# Altium footprint library Sajad_Altium_Library.PcbLib: 333 footprints (part 20 of 21)
Each footprint in its own frame and in the unit in brackets; x right, y up, seen from the top. Pads: shape width x height; smd on the part's side, far side on the other; paste and mask are expansions set on the pad; w line width, h text height; cw(c..) or ccw(c..) is an arc to the next point about the centre after c.
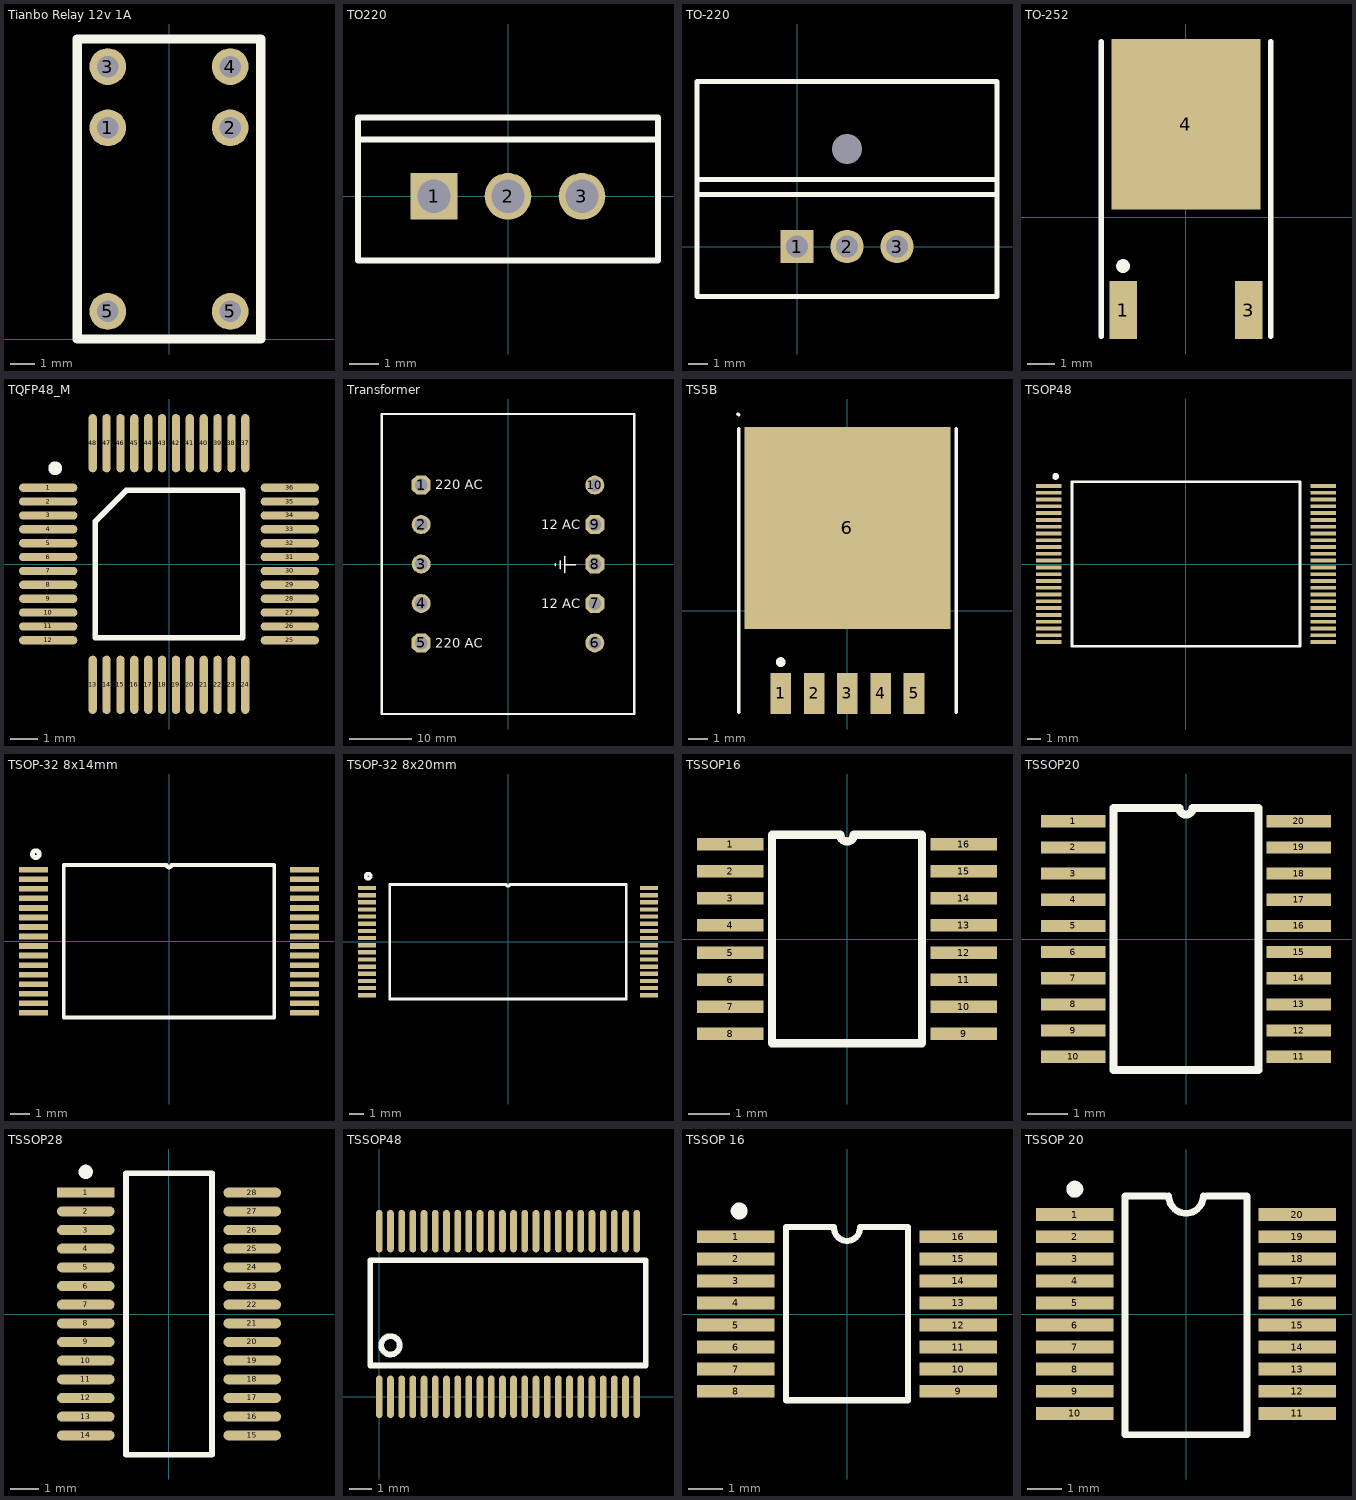
[diagram p19: the footprints below, top view; thin cyan lines are the x and y axes]

## Tianbo Relay 12v 1A [mil] "Tianbo Relay 12v 1A"
pads (6):
  round 60 hole 35: 1(-100,345) 2(100,345) 3(-100,445) 4(100,445) 5(-100,45) 5(100,45)
Top Overlay:
  lines w15: -150,0 -150,490 150,490 150,0 -150,0

## TO220 [mm] "TO220"
pads (3):
  rect 1.6x1.6 hole 1.143: 1(-2.54,0)
  round 1.6 hole 1.143: 2(0,0) 3(2.54,0)
Top Overlay:
  lines w0.2: -5.15,1.946 5.15,1.946 ; -5.15,-2.2 5.15,-2.2 5.15,2.7 -5.15,2.7 -5.15,-2.2
3D body: height 20.8, standoff -7.98, extent -4.95,-2.159 4.95,2.341

## TO-220 [mm] "With Heatsink"
pads (4):
  rect 1.7x1.7 hole 1.1: 1(0,0)
  round 1.7 hole 1.1: 2(2.54,0) 3(5.08,0)
  round 0 hole 1.524: 4(2.54,4.953)
Top Overlay:
  lines w0.254: -5.08,2.642 10.16,2.642 ; -5.08,3.404 10.16,3.404 ; -5.08,-2.54 -5.08,4.953 -5.08,8.382 10.16,8.382 10.16,-2.54 7.366,-2.54 -2.413,-2.54 -5.08,-2.54
3D body: height 20.8, standoff -7.98, extent -2.41,-2.159 7.49,2.341
3D body: height 25, standoff -3.8, extent -4.851,-2.48 9.931,8.322

## TO-252 [mm]
pads (3):
  rect 1x2.1 smd: 1(-2.285,-3.375) 3(2.285,-3.375)
  rect 5.4x6.2 smd: 4(0,3.375)
Top Overlay:
  circle w0.25: c-2.285,-1.775 r0.125
  lines w0.2: -3.085,-4.325 -3.085,6.375 ; 3.085,-4.325 3.085,6.375
3D body: height 2.34, standoff -0.07, extent -3.27,-3.906 3.27,6.033

## TQFP48_M [mm] "48-Pin Thin Quad Flat Pack 0.5 mm Pitch, IPC Low Density"
height 1.6
pads (48):
  oval 2.1x0.3 smd: 1(-4.354,2.75) 2(-4.354,2.25) 3(-4.354,1.75) 4(-4.354,1.25) 5(-4.354,0.75) 6(-4.354,0.25) 7(-4.354,-0.25) 8(-4.354,-0.75) 9(-4.354,-1.25) 10(-4.354,-1.75) 11(-4.354,-2.25) 12(-4.354,-2.75) 25(4.354,-2.75) 26(4.354,-2.25) 27(4.354,-1.75) 28(4.354,-1.25) 29(4.354,-0.75) 30(4.354,-0.25) 31(4.354,0.25) 32(4.354,0.75) 33(4.354,1.25) 34(4.354,1.75) 35(4.354,2.25) 36(4.354,2.75)
  oval 0.3x2.1 smd: 13(-2.75,-4.354) 14(-2.25,-4.354) 15(-1.75,-4.354) 16(-1.25,-4.354) 17(-0.75,-4.354) 18(-0.25,-4.354) 19(0.25,-4.354) 20(0.75,-4.354) 21(1.25,-4.354) 22(1.75,-4.354) 23(2.25,-4.354) 24(2.75,-4.354) 37(2.75,4.354) 38(2.25,4.354) 39(1.75,4.354) 40(1.25,4.354) 41(0.75,4.354) 42(0.25,4.354) 43(-0.25,4.354) 44(-0.75,4.354) 45(-1.25,4.354) 46(-1.75,4.354) 47(-2.25,4.354) 48(-2.75,4.354)
Top Overlay:
  circle w0.25: c-4.1,3.45 r0.125
  lines w0.2: -2.65,-2.65 -2.65,1.541 -1.541,2.65 2.65,2.65 2.65,-2.65 -2.65,-2.65
3D body: height 1.56, standoff -0.01, extent -4.386,-4.386 4.386,4.386

## Transformer [mil] "On Board Transformer"
pads (10):
  oct 120x120 hole 80: 1(-550,500) 5(-550,-500) 7(550,-250) 8(550,0) 9(550,250)
  round 120 hole 80: 2(-550,250) 3(-550,0) 4(-550,-250) 6(550,-500) 10(550,500)
Top Overlay:
  lines w10: 300,-10 300,0 ; 330,-30 330,20 ; 360,-55 360,-5 ; 360,50 360,-5 ; 430,-5 360,-5
  lines w15: -800,-950 -800,950 800,950 800,-950 -800,-950
  text "12 AC" at 210,-280 h60
  text "12 AC" at 210,220 h60
  text "220 AC" at -460,475 h60
  text "220 AC" at -460,-530 h60

## TS5B [mm]
pads (6):
  rect 1.05x2.1 smd: 1(-3.4,-4.225) 2(-1.7,-4.225) 3(0,-4.225) 4(1.7,-4.225) 5(3.4,-4.225)
  rect 10.5x10.3 smd: 6(0,4.225)
Top Overlay:
  circle w0.25: c-3.4,-2.625 r0.125
  lines w0.178: -5.588,10.033 -5.55,9.995 ; -5.55,-5.175 -5.55,9.275 ; 5.55,-5.175 5.55,9.275
3D body: height 4.56, standoff 0, extent -5.08,-4.922 5.08,9.093

## TSOP48 [mil] "Shrink Small Outline, Plastic, Thin; 48 Leads; Body Width 18.4 mm; Pitch 0.5 mm"
height 47.24
pads (48):
  rect 74x11 smd: 1(-397.95,226.38) 2(-397.95,206.69) 3(-397.95,187.01) 4(-397.95,167.32) 5(-397.95,147.64) 6(-397.95,127.95) 7(-397.95,108.27) 8(-397.95,88.58) 9(-397.95,68.9) 10(-397.95,49.21) 11(-397.95,29.53) 12(-397.95,9.84) 13(-397.95,-9.84) 14(-397.95,-29.53) 15(-397.95,-49.21) 16(-397.95,-68.9) 17(-397.95,-88.58) 18(-397.95,-108.27) 19(-397.95,-127.95) 20(-397.95,-147.64) 21(-397.95,-167.32) 22(-397.95,-187.01) 23(-397.95,-206.69) 24(-397.95,-226.38) 25(397.95,-226.38) 26(397.95,-206.69) 27(397.95,-187.01) 28(397.95,-167.32) 29(397.95,-147.64) 30(397.95,-127.95) 31(397.95,-108.27) 32(397.95,-88.58) 33(397.95,-68.9) 34(397.95,-49.21) 35(397.95,-29.53) 36(397.95,-9.84) 37(397.95,9.84) 38(397.95,29.53) 39(397.95,49.21) 40(397.95,68.9) 41(397.95,88.58) 42(397.95,108.27) 43(397.95,127.95) 44(397.95,147.64) 45(397.95,167.32) 46(397.95,187.01) 47(397.95,206.69) 48(397.95,226.38)
Top Overlay:
  circle w9.84: c-377.95,253.94 r4.92
  lines w7.87: -330.71,-238.19 330.71,-238.19 330.71,238.19 -330.71,238.19 -330.71,-238.19
3D body: height 41.47, standoff -1.47, extent -393.76,-236.21 393.78,236.23

## TSOP-32 8x14mm [mm] "Use with SST39VF020"
pads (32):
  rect 1.524x0.3 smd: 1(-7.104,3.75) 2(-7.104,3.25) 3(-7.104,2.75) 4(-7.104,2.25) 5(-7.104,1.75) 6(-7.104,1.25) 7(-7.104,0.75) 8(-7.104,0.25) 9(-7.104,-0.25) 10(-7.104,-0.75) 11(-7.104,-1.25) 12(-7.104,-1.75) 13(-7.104,-2.25) 14(-7.104,-2.75) 15(-7.104,-3.25) 16(-7.104,-3.75) 17(7.104,-3.75) 18(7.104,-3.25) 19(7.104,-2.75) 20(7.104,-2.25) 21(7.104,-1.75) 22(7.104,-1.25) 23(7.104,-0.75) 24(7.104,-0.25) 25(7.104,0.25) 26(7.104,0.75) 27(7.104,1.25) 28(7.104,1.75) 29(7.104,2.25) 30(7.104,2.75) 31(7.104,3.25) 32(7.104,3.75)
Top Overlay:
  circle w0.254: c-6.985,4.572 r0.18
  lines w0.2: -5.515,-4 -5.515,4 -0.125,4 ccw(c0,4) 0.125,4 5.515,4 5.515,-4 -5.515,-4

## TSOP-32 8x20mm [mm] "Use with AS7C31024B"
pads (32):
  rect 1.27x0.3 smd: 1(-9.854,3.75) 2(-9.854,3.25) 3(-9.854,2.75) 4(-9.854,2.25) 5(-9.854,1.75) 6(-9.854,1.25) 7(-9.854,0.75) 8(-9.854,0.25) 9(-9.854,-0.25) 10(-9.854,-0.75) 11(-9.854,-1.25) 12(-9.854,-1.75) 13(-9.854,-2.25) 14(-9.854,-2.75) 15(-9.854,-3.25) 16(-9.854,-3.75) 17(9.854,-3.75) 18(9.854,-3.25) 19(9.854,-2.75) 20(9.854,-2.25) 21(9.854,-1.75) 22(9.854,-1.25) 23(9.854,-0.75) 24(9.854,-0.25) 25(9.854,0.25) 26(9.854,0.75) 27(9.854,1.25) 28(9.854,1.75) 29(9.854,2.25) 30(9.854,2.75) 31(9.854,3.25) 32(9.854,3.75)
Top Overlay:
  circle w0.254: c-9.779,4.572 r0.18
  lines w0.2: -8.265,-4 8.265,-4 8.265,4 0.125,4 cw(c0,4) -0.125,4 -8.265,4 -8.265,-4

## TSSOP16 [mm] "TSSOP 16 Pin"
height 1.2
pads (16):
  rect 1.6x0.3 smd: 1(-2.8,2.275) 2(-2.8,1.625) 3(-2.8,0.975) 4(-2.8,0.325) 5(-2.8,-0.325) 6(-2.8,-0.975) 7(-2.8,-1.625) 8(-2.8,-2.275) 9(2.8,-2.275) 10(2.8,-1.625) 11(2.8,-0.975) 12(2.8,-0.325) 13(2.8,0.325) 14(2.8,0.975) 15(2.8,1.625) 16(2.8,2.275)
Top Overlay:
  lines w0.2: -0.175,2.5 -0.913,2.5 -1.8,2.5 -1.8,-2.5 1.8,-2.5 1.8,2.5 0.913,2.5 0.175,2.5 ; -0.162,2.5 ccw(c0,2.5) 0.163,2.5
3D body: height 1.28, standoff 0, extent -3.2,-2.5 3.2,2.5

## TSSOP20 [mm] "TSSOP 20 Pin"
height 1.2
pads (20):
  rect 1.6x0.3 smd: 1(-2.8,2.925) 2(-2.8,2.275) 3(-2.8,1.625) 4(-2.8,0.975) 5(-2.8,0.325) 6(-2.8,-0.325) 7(-2.8,-0.975) 8(-2.8,-1.625) 9(-2.8,-2.275) 10(-2.8,-2.925) 11(2.8,-2.925) 12(2.8,-2.275) 13(2.8,-1.625) 14(2.8,-0.975) 15(2.8,-0.325) 16(2.8,0.325) 17(2.8,0.975) 18(2.8,1.625) 19(2.8,2.275) 20(2.8,2.925)
Top Overlay:
  lines w0.2: -1.8,-3.25 -1.8,3.25 -0.162,3.25 ccw(c0,3.25) 0.162,3.25 1.8,3.25 1.8,-3.25 -1.8,-3.25
3D body: height 1.28, standoff 0, extent -3.2,-3.25 3.2,3.25

## TSSOP28 [mm] "TSOP, 28-Leads, Body 9.7x4.4mm, Pitch 0.65mm, IPC Low Density"
height 1.2
pads (28):
  rect 2x0.35 smd: 1(-2.9,4.225)
  oval 2x0.35 smd: 2(-2.9,3.575) 3(-2.9,2.925) 4(-2.9,2.275) 5(-2.9,1.625) 6(-2.9,0.975) 7(-2.9,0.325) 8(-2.9,-0.325) 9(-2.9,-0.975) 10(-2.9,-1.625) 11(-2.9,-2.275) 12(-2.9,-2.925) 13(-2.9,-3.575) 14(-2.9,-4.225) 15(2.9,-4.225) 16(2.9,-3.575) 17(2.9,-2.925) 18(2.9,-2.275) 19(2.9,-1.625) 20(2.9,-0.975) 21(2.9,-0.325) 22(2.9,0.325) 23(2.9,0.975) 24(2.9,1.625) 25(2.9,2.275) 26(2.9,2.925) 27(2.9,3.575) 28(2.9,4.225)
Top Overlay:
  circle w0.25: c-2.9,4.95 r0.125
  lines w0.2: -1.5,-4.9 -1.5,4.9 1.5,4.9 1.5,-4.9 -1.5,-4.9
3D body: height 1.2, standoff 0, extent -3.2,-4.883 3.2,4.917

## TSSOP48 [mm]
pads (48):
  oval 0.3x1.9 smd: 1(0,0) 2(0.5,0) 3(1,0) 4(1.5,0) 5(2,0) 6(2.5,0) 7(3,0) 8(3.5,0) 9(4,0) 10(4.5,0) 11(5,0) 12(5.5,0) 13(6,0) 14(6.5,0) 15(7,0) 16(7.5,0) 17(8,0) 18(8.5,0) 19(9,0) 20(9.5,0) 21(10,0) 22(10.5,0) 23(11,0) 24(11.5,0) 25(11.5,7.4) 26(11,7.4) 27(10.5,7.4) 28(10,7.4) 29(9.5,7.4) 30(9,7.4) 31(8.5,7.4) 32(8,7.4) 33(7.5,7.4) 34(7,7.4) 35(6.5,7.4) 36(6,7.4) 37(5.5,7.4) 38(5,7.4) 39(4.5,7.4) 40(4,7.4) 41(3.5,7.4) 42(3,7.4) 43(2.5,7.4) 44(2,7.4) 45(1.5,7.4) 46(1,7.4) 47(0.5,7.4) 48(0,7.4)
Top Overlay:
  circle w0.254: c0.5,2.3 r0.412
  lines w0.254: -0.4,1.4 11.9,1.4 11.9,6.1 -0.4,6.1 -0.4,1.4

## TSSOP 16 [mm] "16-pin, 4.40 mm body, 0.65 mm pitch"
height 2
pads (16):
  rect 2.286x0.381 smd: 1(-3.275,2.275) 2(-3.275,1.625) 3(-3.275,0.975) 4(-3.275,0.325) 5(-3.275,-0.325) 6(-3.275,-0.975) 7(-3.275,-1.625) 8(-3.275,-2.275) 9(3.275,-2.275) 10(3.275,-1.625) 11(3.275,-0.975) 12(3.275,-0.325) 13(3.275,0.325) 14(3.275,0.975) 15(3.275,1.625) 16(3.275,2.275)
Top Overlay:
  circle w0.25: c-3.175,3.033 r0.125
  lines w0.178: -0.381,2.533 ccw(c0,2.533) 0.381,2.533 ; -0.381,2.569 -1.8,2.569 -1.8,-2.54 1.8,-2.54 1.8,2.569 0.381,2.569
3D body: height 1.1, standoff 0, extent -3.2,-2.5 3.2,2.5

## TSSOP 20 [mm] "20-pin, 4.40 mm body, 0.65 mm pitch"
height 2
pads (20):
  rect 2.286x0.381 smd: 1(-3.275,2.925) 2(-3.275,2.275) 3(-3.275,1.625) 4(-3.275,0.975) 5(-3.275,0.325) 6(-3.275,-0.325) 7(-3.275,-0.975) 8(-3.275,-1.625) 9(-3.275,-2.275) 10(-3.275,-2.925) 11(3.275,-2.925) 12(3.275,-2.275) 13(3.275,-1.625) 14(3.275,-0.975) 15(3.275,-0.325) 16(3.275,0.325) 17(3.275,0.975) 18(3.275,1.625) 19(3.275,2.275) 20(3.275,2.925)
Top Overlay:
  circle w0.25: c-3.275,3.675 r0.125
  lines w0.2: -0.6,3.473 -1.8,3.473 -1.8,-3.556 1.8,-3.556 1.8,3.473 0.6,3.473 ; -0.508,3.473 ccw(c0,3.473) 0.508,3.473
3D body: height 1.1, standoff 0, extent -3.2,-3.937 3.2,3.963